# Altium footprint library Relay.PcbLib: 60 footprints (part 3 of 4)
Each footprint in its own frame and in the unit in brackets; x right, y up, seen from the top. Pads: shape width x height; smd on the part's side, far side on the other; paste and mask are expansions set on the pad; w line width, h text height; cw(c..) or ccw(c..) is an arc to the next point about the centre after c.
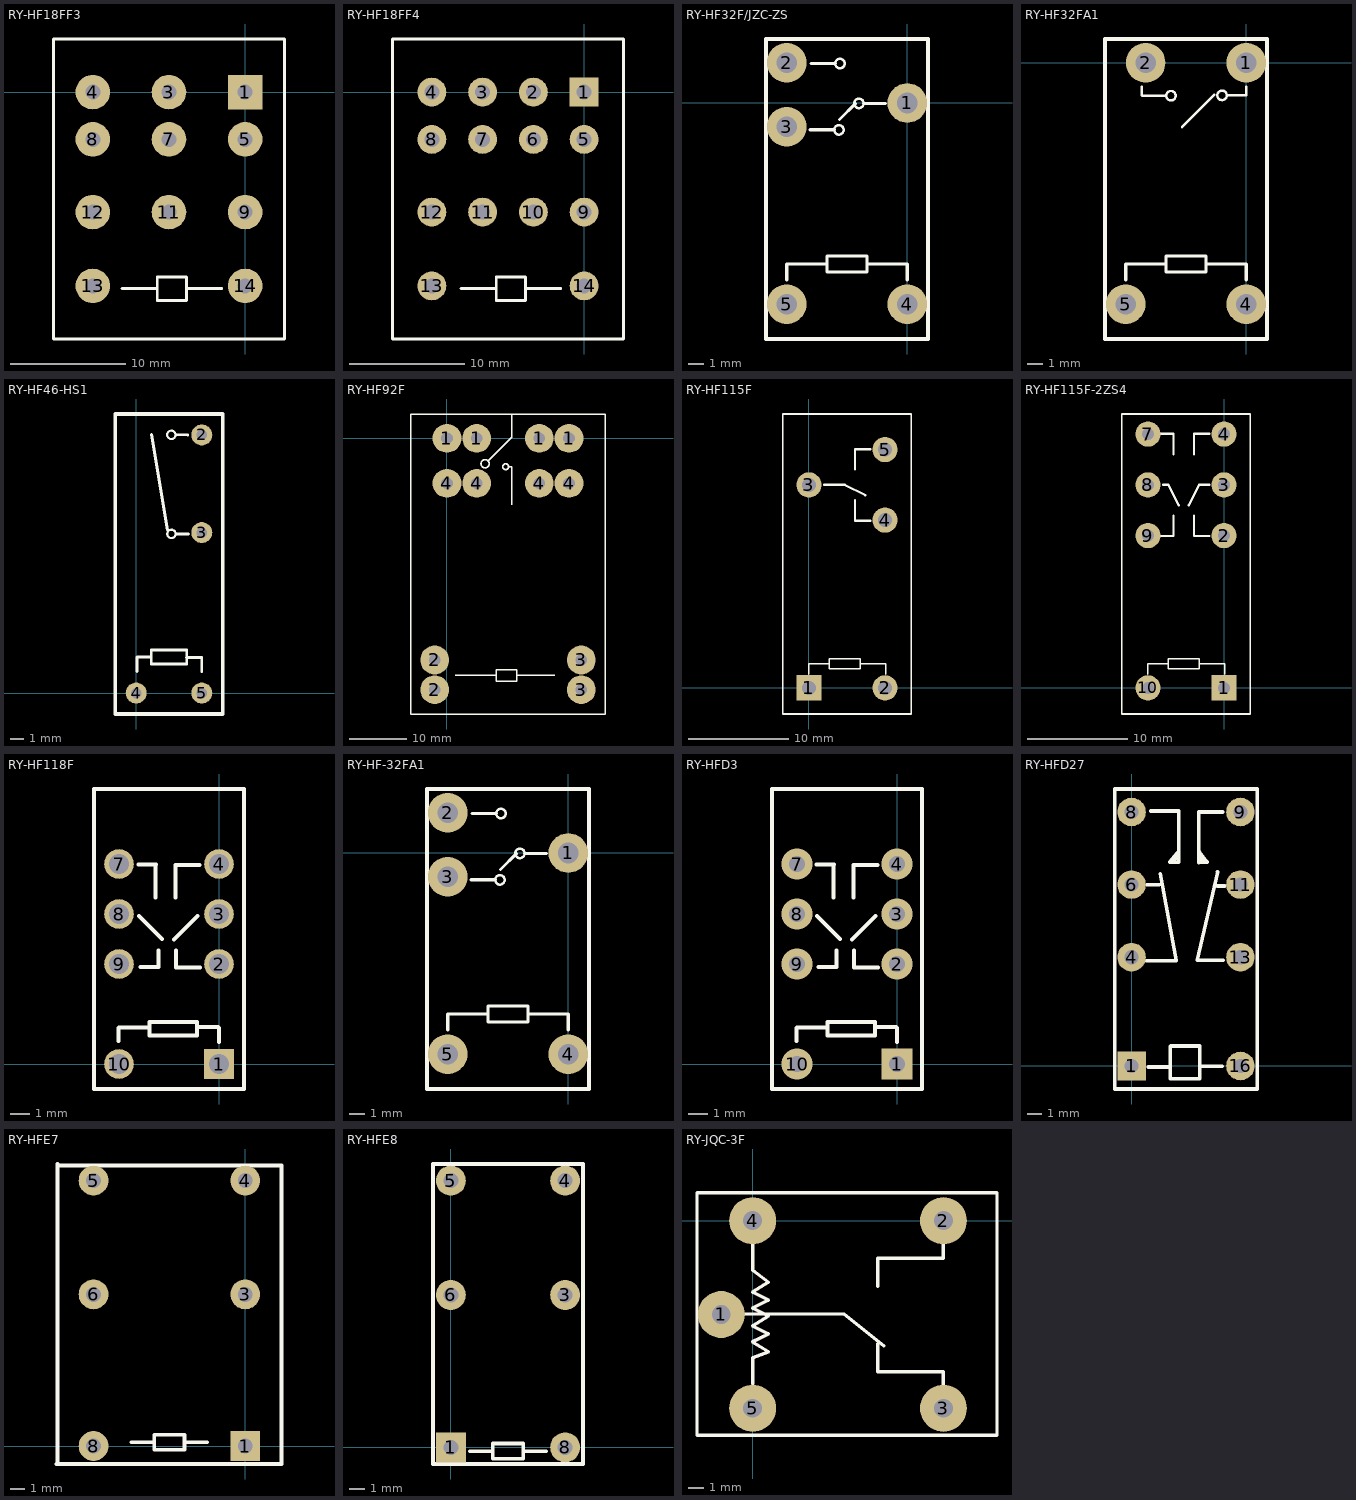
[diagram p2: the footprints below, top view; thin cyan lines are the x and y axes]

## RY-HF18FF3 [mm]
pads (11):
  rect 3x3 hole 1.3: 1(0,0)
  round 3 hole 1.3: 3(-6.604,0) 4(-13.2,0) 5(0,-4.1) 7(-6.604,-4.1) 8(-13.2,-4.1) 9(0,-10.4) 11(-6.604,-10.4) 12(-13.2,-10.4) 13(-13.2,-16.8) 14(0,-16.8)
Top Overlay:
  lines w0.254: -10.664,-17.036 -7.616,-17.036 ; -5.076,-17.036 -2.028,-17.036 ; -16.6,-21.4 3.4,-21.4 3.4,4.6 -16.6,4.6 -16.6,-21.4 ; -7.616,-18.052 -7.616,-16.02 -5.076,-16.02 -5.076,-18.052 -7.616,-18.052

## RY-HF18FF4 [mm]
pads (14):
  rect 2.5x2.5 hole 1.3: 1(0,0)
  round 2.5 hole 1.3: 2(-4.4,0) 3(-8.8,0) 4(-13.2,0) 5(0,-4.1) 6(-4.4,-4.1) 7(-8.8,-4.1) 8(-13.2,-4.1) 9(0,-10.4) 10(-4.4,-10.4) 11(-8.8,-10.4) 12(-13.2,-10.4) 13(-13.2,-16.8) 14(0,-16.8)
Top Overlay:
  lines w0.254: -10.664,-17.036 -7.616,-17.036 ; -5.076,-17.036 -2.028,-17.036 ; -16.6,-21.4 -16.6,4.6 3.4,4.6 3.4,-21.4 -16.6,-21.4 ; -7.616,-18.052 -5.076,-18.052 -5.076,-16.02 -7.616,-16.02 -7.616,-18.052

## RY-HF32F/JZC-ZS [mm]
pads (5):
  round 2.5 hole 1.3: 1(0,0) 2(-7.62,2.54) 3(-7.62,-1.5) 4(0,-12.7) 5(-7.62,-12.7)
Top Overlay:
  circle w0.15: c-4.321,-1.696 r0.3
  circle w0.15: c-3.058,-0.024 r0.3
  circle w0.15: c-4.255,2.492 r0.3
  lines w0.203: -7.62,-11.176 -7.62,-10.16 -5.08,-10.16 ; -6.145,-1.696 -4.621,-1.696 ; -6.079,2.492 -4.555,2.492 ; -4.282,-1.04 -3.266,-0.024 ; -2.758,-0.024 -1.386,-0.024 ; -2.54,-10.16 0,-10.16 0,-11.176 ; -5.08,-10.668 -3.556,-10.668 -2.54,-10.668 -2.54,-9.652 -5.08,-9.652 -5.08,-10.668
  lines w0.254: -8.91,-14.9 1.29,-14.9 1.29,4.04 -8.91,4.04 -8.91,-14.9

## RY-HF32FA [mm]

## RY-HF32FA1 [mm]
pads (4):
  round 2.5 hole 1.3: 1(0,0) 2(-6.36,0) 4(0,-15.24) 5(-7.62,-15.24)
Top Overlay:
  circle w0.15: c-1.534,-2.056 r0.3
  circle w0.15: c-4.763,-2.08 r0.3
  lines w0.152: -6.604,-1.524 -6.604,-2.063 -6.587,-2.08 -5.063,-2.08 ; -4.064,-4.064 -2.032,-2.032 ; -1.234,-2.056 -0.024,-2.056 0,-2.032 0,-1.524
  lines w0.203: -7.62,-13.716 -7.62,-12.7 -5.08,-12.7 ; -2.54,-12.7 0,-12.7 0,-13.716 ; -5.08,-13.208 -3.556,-13.208 -2.54,-13.208 -2.54,-12.192 -5.08,-12.192 -5.08,-13.208
  lines w0.254: -8.91,-17.44 1.29,-17.44 1.29,1.5 -8.91,1.5 -8.91,-17.44

## RY-HF46-HS1 [mm]
pads (4):
  round 1.5 hole 0.75: 2(4.7,18.5) 3(4.7,11.5) 4(0,0) 5(4.7,0)
Top Overlay:
  circle w0.15: c2.517,18.507 r0.3
  circle w0.15: c2.526,11.408 r0.3
  lines w0.203: 0.049,1.555 0.049,2.571 ; 1.087,18.521 2.247,11.678 ; 2.85,18.51 3.697,18.507 ; 2.855,11.394 3.748,11.397 ; 4.7,1.524 4.7,2.54 ; 1.077,2.074 1.077,3.09 3.617,3.09 3.617,2.074 2.093,2.074 1.077,2.074
  lines w0.208: 0.049,2.571 1.07,2.571 ; 3.617,2.556 4.684,2.556
  lines w0.254: -1.5,-1.5 -1.5,20 6.2,20 6.2,-1.5 -1.5,-1.5
3D body "HF46F.STEP": height 15.3, standoff -4, extent -1.131,-1.106 5.969,19.394

## RY-HF92F [mm]
pads (12):
  round 5 hole 2: 1(0,0) 1(5.15,0) 1(16,0) 1(21.15,0) 2(-2.125,-43.575) 2(-2.125,-38.425) 3(23.275,-43.575) 3(23.275,-38.425) 4(0,-7.8) 4(5.15,-7.8) 4(16,-7.8) 4(21.15,-7.8)
Top Overlay:
  circle w0.3: c6.614,-4.413 r0.718
  circle w0.3: c10.17,-4.921 r0.508
  lines w0.254: 1.431,-41.092 8.543,-41.092 ; 7.122,-3.905 11.186,0.159 ; 10.678,-4.921 11.186,-4.921 11.186,-11.525 ; 11.186,0.159 11.186,4.212 ; 12.099,-41.092 18.703,-41.092 ; -6.275,-47.788 27.425,-47.788 27.425,4.212 -6.275,4.212 -6.275,-47.788 ; 8.543,-42.108 8.543,-40.076 12.099,-40.076 12.099,-42.108 8.543,-42.108

## RY-HF115F [mm]
pads (5):
  rect 2.5x2.5 hole 1.4: 1(0,0)
  round 2.5 hole 1.4: 2(7.56,0) 3(0,20.16) 4(7.56,16.66) 5(7.56,23.66)
Top Overlay:
  lines w0.152: 0,1.364 0,2.38 2.032,2.38 ; 5.08,2.38 7.62,2.38 7.62,1.364 ; -2.6,-2.6 10.16,-2.6 10.16,27.2 -2.6,27.2 -2.6,-2.6 ; 2.032,1.872 5.08,1.872 5.08,2.888 2.032,2.888 2.032,1.872
  lines w0.24: 1.524,20.16 3.556,20.16 5.588,19.144 ; 4.572,18.636 4.572,16.604 6.096,16.604 ; 4.572,21.684 4.572,23.716 6.096,23.716

## RY-HF115F-2ZS4 [mm]
pads (8):
  rect 2.5x2.5 hole 1.2: 1(0,0)
  round 2.5 hole 1.2: 2(0,15.12) 3(0,20.16) 4(0,25.2) 7(-7.56,25.2) 8(-7.56,20.16) 9(-7.56,15.12) 10(-7.56,0)
Top Overlay:
  lines w0.152: -7.56,1.364 -7.56,2.38 -5.528,2.38 ; -2.48,2.38 0.06,2.38 0.06,1.364 ; -10.16,-2.6 -10.16,27.2 2.6,27.2 2.6,-2.6 -10.16,-2.6 ; -5.528,1.872 -5.528,2.888 -2.48,2.888 -2.48,1.872 -5.528,1.872
  lines w0.24: -6.544,15.08 -5.02,15.08 -5.02,17.112 ; -6.544,25.24 -5.02,25.24 -5.02,23.208 ; -5.528,20.16 -4.512,18.128 ; -3.496,18.128 -2.48,20.16 ; -2.988,17.112 -2.988,15.08 -1.464,15.08 ; -2.988,23.208 -2.988,25.24 -1.464,25.24
  lines w0.254: -6.036,20.16 -5.528,20.16 ; -2.48,20.16 -1.464,20.16

## RY-HF118F [mm]
pads (8):
  rect 1.5x1.5 hole 1: 1(0,0)
  round 1.5 hole 1: 2(0,5.08) 3(0,7.62) 4(0,10.16) 7(-5.08,10.16) 8(-5.08,7.62) 9(-5.08,5.08) 10(-5.08,0)
Top Overlay:
  lines w0.203: -5.109,1.162 -5.109,1.829 ; -5.074,1.864 -3.518,1.864 ; -4.088,10.128 -3.202,10.128 -3.216,10.114 -3.216,8.467 ; -4.074,7.526 -2.898,6.35 ; -3.978,4.925 -3.078,4.925 -3.078,5.769 ; -2.289,6.336 -1.099,7.526 ; -2.206,8.467 -2.206,10.1 -1.002,10.1 ; -2.192,5.769 -2.192,4.911 -0.974,4.911 ; -1.118,1.882 -0.059,1.882 ; 0.003,1.109 0.003,1.82 ; -6.34,-1.27 1.26,-1.27 1.26,13.97 -6.34,13.97 -6.34,-1.27 ; -3.518,1.457 -3.518,2.14 -1.118,2.14 -1.118,1.456 -3.517,1.456 -3.518,1.457

## RY-HF-32FA1 [mm]
pads (5):
  round 2.5 hole 1.3: 1(0,0) 2(-7.62,2.54) 3(-7.62,-1.5) 4(0,-12.7) 5(-7.62,-12.7)
Top Overlay:
  circle w0.15: c-4.255,2.492 r0.3
  circle w0.15: c-3.058,-0.024 r0.3
  circle w0.15: c-4.321,-1.696 r0.3
  lines w0.203: -7.62,-11.176 -7.62,-10.16 -5.08,-10.16 ; -6.145,-1.696 -4.621,-1.696 ; -6.079,2.492 -4.555,2.492 ; -4.282,-1.04 -3.266,-0.024 ; -2.758,-0.024 -1.386,-0.024 ; -2.54,-10.16 0,-10.16 0,-11.176 ; -5.08,-10.668 -5.08,-9.652 -2.54,-9.652 -2.54,-10.668 -3.556,-10.668 -5.08,-10.668
  lines w0.254: -8.91,-14.9 -8.91,4.04 1.29,4.04 1.29,-14.9 -8.91,-14.9

## RY-HFD3 [mm]
pads (8):
  rect 1.6x1.6 hole 0.8: 1(0,0)
  round 1.6 hole 0.8: 2(0,5.08) 3(0,7.62) 4(0,10.16) 7(-5.08,10.16) 8(-5.08,7.62) 9(-5.08,5.08) 10(-5.08,0)
Top Overlay:
  lines w0.203: -5.109,1.162 -5.109,1.829 ; -5.074,1.864 -3.518,1.864 ; -4.088,10.128 -3.202,10.128 -3.216,10.114 -3.216,8.467 ; -4.074,7.526 -2.898,6.35 ; -3.978,4.925 -3.078,4.925 -3.078,5.769 ; -2.289,6.336 -1.099,7.526 ; -2.206,8.467 -2.206,10.1 -1.002,10.1 ; -2.192,5.769 -2.192,4.911 -0.974,4.911 ; -1.118,1.882 -0.059,1.882 ; 0.003,1.109 0.003,1.82 ; -6.34,-1.27 -6.34,13.97 1.26,13.97 1.26,-1.27 -6.34,-1.27 ; -3.518,1.457 -3.517,1.456 -1.118,1.456 -1.118,2.14 -3.518,2.14 -3.518,1.457

## RY-HFD27 [mm]
pads (8):
  rect 2x2 hole 1: 1(0,0)
  round 2 hole 1: 4(0,7.62) 6(0,12.7) 8(0,17.78) 9(7.62,17.78) 11(7.62,12.7) 13(7.62,7.62) 16(7.62,0)
Top Overlay:
  lines w0.254: 1.022,7.375 3.128,7.375 2.004,13.46 ; 1.058,12.693 1.932,12.693 ; 1.183,-0.066 2.629,-0.066 ; 1.344,17.85 3.307,17.85 3.306,14.263 2.664,14.263 3.217,14.923 3.021,14.406 ; 4.734,15.013 5.287,14.281 5.269,14.263 4.698,14.245 4.699,17.779 6.394,17.779 ; 4.805,14.781 4.966,14.352 ; 4.877,-0.013 6.34,-0.013 ; 6.001,12.604 6.519,12.604 ; 6.019,13.585 4.609,7.411 6.429,7.411 ; -1.19,-1.61 8.81,-1.61 8.81,19.39 -1.19,19.39 -1.19,-1.61 ; 2.7,-0.887 2.7,1.076 2.7,1.361 2.736,1.397 4.77,1.397 4.77,-0.869 4.752,-0.887 2.7,-0.887
3D body "User Library-OMRON G5V-2.STEP": height 10.92, standoff -4, extent -1.143,-1.27 8.857,19.13

## RY-HFE7 [mm]
pads (6):
  rect 2x2 hole 1: 1(0,0)
  round 2 hole 1: 3(0,10.16) 4(0,17.78) 5(-10.16,17.78) 6(-10.16,10.16) 8(-10.16,0)
Top Overlay:
  lines w0.254: -12.634,-1.204 2.42,-1.204 2.42,18.796 -12.58,18.796 ; -12.58,-1.11 -12.58,18.89 ; -7.62,0.254 -6.096,0.254 ; -4.064,0.254 -2.54,0.254 ; -6.096,-0.254 -4.064,-0.254 -4.064,0.762 -6.096,0.762 -6.096,-0.254

## RY-HFE8 [mm]
pads (6):
  rect 2x2 hole 1: 1(0,0)
  round 2 hole 1: 3(7.62,10.16) 4(7.62,17.78) 5(0,17.78) 6(0,10.16) 8(7.62,0)
Top Overlay:
  lines w0.254: 1.27,-0.254 2.794,-0.254 ; 4.826,-0.254 6.35,-0.254 ; -1.19,-1.11 -1.19,18.89 8.81,18.89 8.81,-1.11 -1.19,-1.11 ; 2.794,-0.762 4.826,-0.762 4.826,0.254 2.794,0.254 2.794,-0.762

## RY-JQC-3F [mm]
pads (5):
  round 3 hole 1.2: 1(-2,-6) 2(12.2,0) 3(12.2,-12) 4(0,0) 5(0,-12)
Top Overlay:
  lines w0.22: -0.508,-5.969 5.842,-5.969 8.382,-8.001 ; 0,-10.414 0,-8.763 1.016,-8.382 0,-7.747 1.016,-7.239 0,-6.731 1.016,-6.096 0,-5.588 1.016,-5.08 0,-4.572 1.016,-3.937 0,-3.175 0,-1.524 ; 8.001,-7.874 8.001,-9.652 12.192,-9.652 12.192,-10.541 ; 8.001,-4.191 8.001,-2.413 12.192,-2.413 12.192,-1.524 ; -3.556,-13.716 -3.556,1.778 15.621,1.778 15.621,-13.716 -3.556,-13.716
3D body "User Library-SONGLE Relay SRU-12VDC-SL-C.STEP": height 15.3, standoff -5, extent -3.454,-13.722 15.646,1.778